# Altium footprint library Cty1.PcbLib: 1378 footprints (part 1 of 87)
Each footprint in its own frame and in the unit in brackets; x right, y up, seen from the top. Pads: shape width x height; smd on the part's side, far side on the other; paste and mask are expansions set on the pad; w line width, h text height; cw(c..) or ccw(c..) is an arc to the next point about the centre after c.
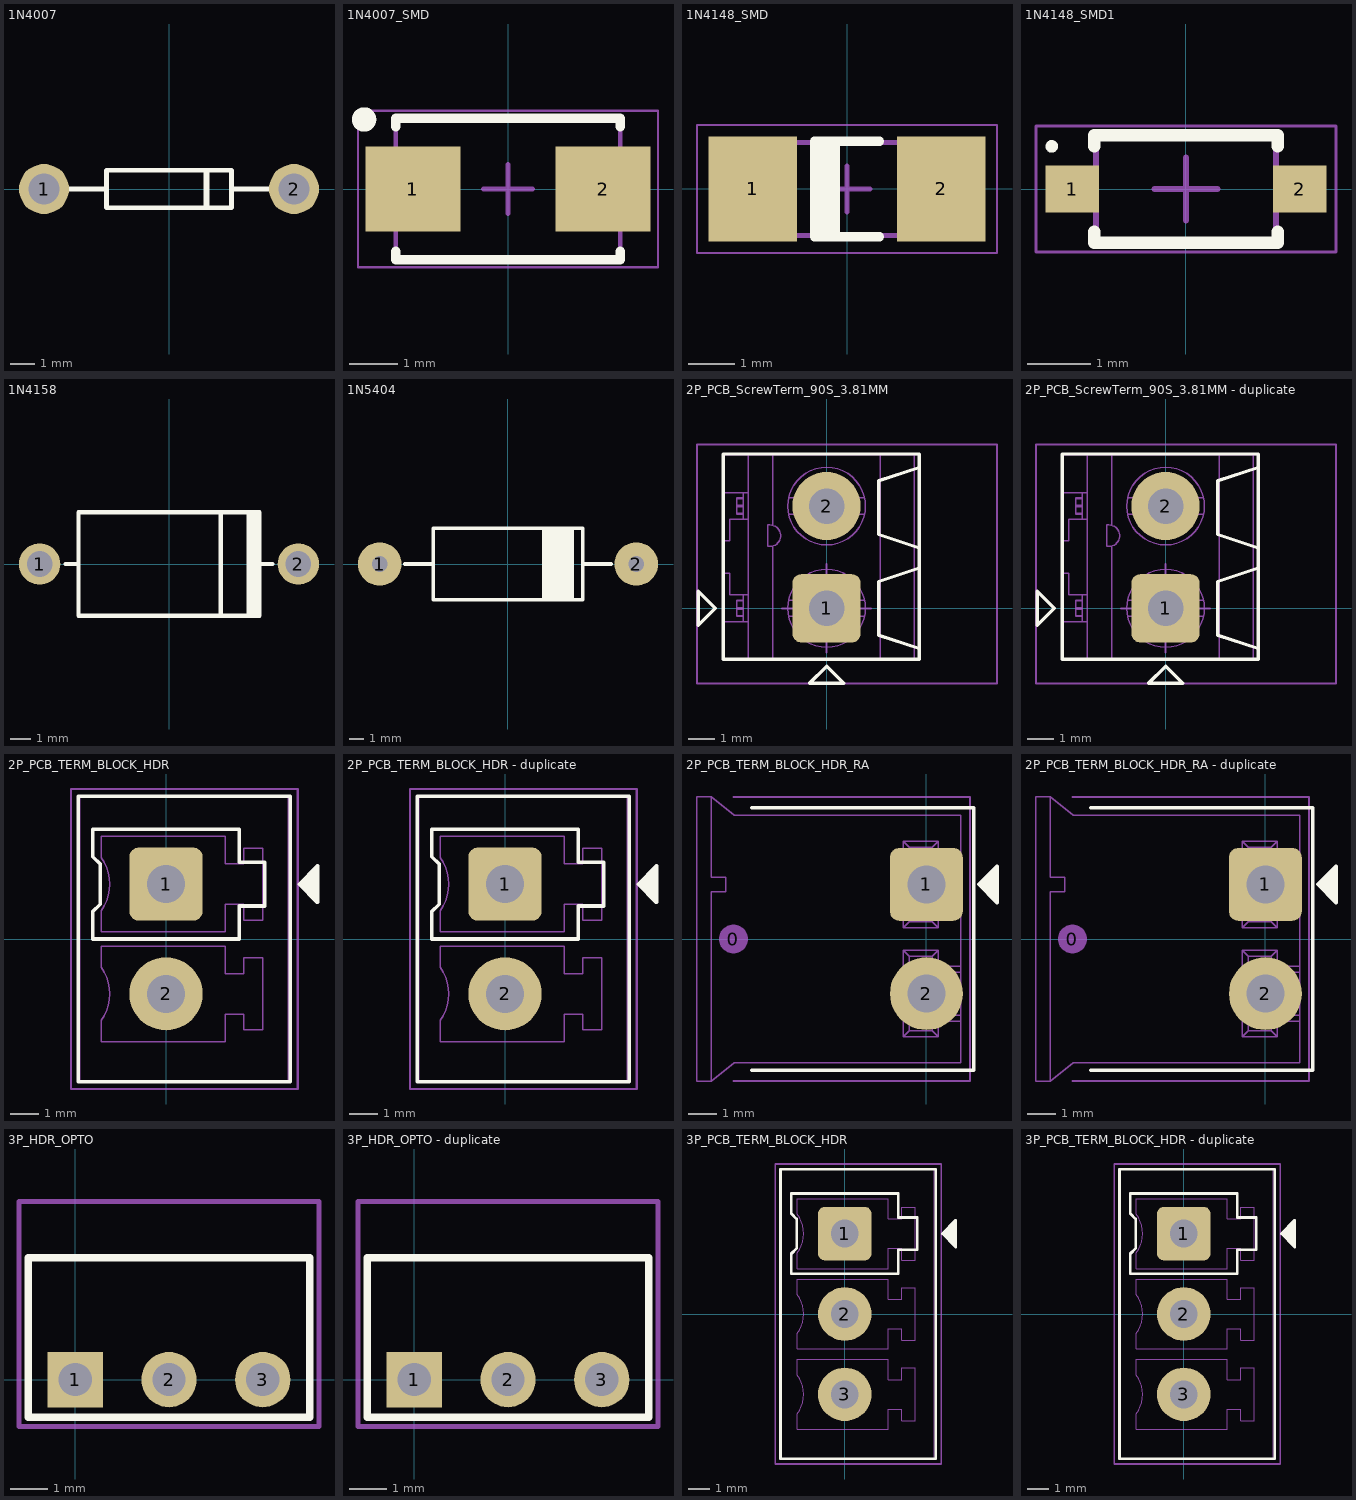
[diagram p0: the footprints below, top view; thin cyan lines are the x and y axes]

## 1N4007 [mil] "Diode 2A"
height 20
pads (2):
  round 80 hole 50: 1(-200,0) 2(200,0)
Top Overlay:
  lines w7.87: -170,0 -101,0 ; 100,0 200,0 ; -100,-30 100,-30 100,30 -100,30 -100,-30
  lines w10: 60,-27 60,27

## 1N4007_SMD [mm] "SODFL, 2-Leads, Body 2.90x5.30mm, IPC Medium Density"
height 2.44
pads (2):
  rect 1.95x1.75 smd: 1(-1.95,0) 2(1.95,0)
Top Overlay:
  circle w0.25: c-2.95,1.425 r0.125
  lines w0.2: -2.3,-1.275 -2.3,-1.45 2.3,-1.45 2.3,-1.275 ; -2.3,1.275 -2.3,1.45 2.3,1.45 2.3,1.275
Mechanical 13:
  lines w0.1: -2.3,-1.45 2.3,-1.45 2.3,1.45 -2.3,1.45 -2.3,-1.45
Mechanical 15:
  lines w0.05: -3.075,-1.6 3.075,-1.6 3.075,1.6 -3.075,1.6 -3.075,-1.6
  lines w0.1: -0.5,0 0.5,0 ; 0,-0.5 0,0.5
3D body "User Library-DO-214AC(SMA).STEP": height 2.3, standoff 0.01, extent -2.743,-1.397 2.743,1.397

## 1N4148_SMD [mm] "MELF Diode, 2-Leads, Body 5.00x2.00mm, IPC Medium Density"
height 2
pads (2):
  rect 1.9x2.25 smd: 1(-2.025,0) 2(2.025,0)
Top Overlay:
  rectangle: -0.7,-1.025 -0.15,1.025
  lines w0.2: 0.7,-1.025 -0.7,-1.025 -0.7,1.025 0.7,1.025
Mechanical 13:
  lines w0.1: -2.5,-1 2.5,-1 2.5,1 -2.5,1 -2.5,-1
Mechanical 15:
  lines w0.05: -3.225,-1.375 3.225,-1.375 3.225,1.375 -3.225,1.375 -3.225,-1.375
  lines w0.1: -0.5,0 0.5,0 ; 0,-0.5 0,0.5
3D body: height 1.98, standoff 0.04, extent -1.25,-0.97 1.25,0.966
3D body: height 1.99, standoff 0, extent -2.5,-1 -1.25,0.996
3D body: height 1.98, standoff 0.04, extent -0.65,-0.971 -0.05,0.967
3D body: height 1.99, standoff 0, extent 1.25,-1 2.5,0.996

## 1N4148_SMD1 [mm] "SODFL, 2-Leads, Body 1.70x3.90mm, IPC Medium Density"
height 1.45
pads (2):
  rect 0.85x0.75 smd: 1(-1.8,0) 2(1.8,0)
Top Overlay:
  circle w0.1: c-2.125,0.675 r0.05
  lines w0.2: -1.45,-0.675 -1.45,-0.85 1.45,-0.85 1.45,-0.675 ; -1.45,0.675 -1.45,0.85 1.45,0.85 1.45,0.675
Mechanical 13:
  lines w0.1: -1.425,-0.85 1.425,-0.85 1.425,0.85 -1.425,0.85 -1.425,-0.85
Mechanical 15:
  lines w0.05: -2.375,-1 2.375,-1 2.375,1 -2.375,1 -2.375,-1
  lines w0.1: -0.5,0 0.5,0 ; 0,-0.5 0,0.5
3D body "User Library-1N4148WSm.STEP": height 1.06, standoff -0.04, extent -1.877,-0.85 1.877,0.85

## 1N4158 [mil] "Diode 5A"
height 118.11
pads (2):
  round 80 hole 50: 1(-250,0) 2(250,0)
Top Overlay:
  rectangle: 150,-100 175,100
  lines w7.87: -200,0 -175,0 ; 100,-100 100,100 ; 175,0 200,0 ; -175,-100 -175,100 175,100 175,-100 -175,-100

## 1N5404 [mil]
pads (2):
  round 120 hole 44: 1(-354.33,0) 2(354.33,0)
Top Overlay:
  rectangle: 98.43,-98.43 177.17,98.43
  lines w10: -285.43,0 -206.69,0 ; 98.43,-98.43 98.43,98.43 ; 177.17,-98.43 177.17,98.43 ; 206.69,0 285.43,0 ; -206.69,-98.43 -206.69,98.43 206.69,98.43 206.69,-98.43 -206.69,-98.43
3D body "DIODE07-3D.STEP": height 200, standoff -100, extent -370,-98.43 370,101.57

## 2P_PCB_ScrewTerm_90S_3.81MM [mil] "TERM BLOCK 2POS SIDE ENT STACKABLE 3.81MM"
height 334.65
pads (2):
  rrect25% 100x100 hole 52: 1(0,0)
  round 100 hole 52: 2(0,150)
Top Overlay:
  lines w5: 135.83,-59.06 76.78,-39.37 76.78,39.37 135.83,59.06 ; 135.83,88.58 76.78,108.27 76.78,187.01 135.83,206.69 ; -188,-25 -188,25 -163,0 -188,-25 ; -151.57,-75 135.83,-75 135.83,226.38 -151.57,226.38 -151.57,-75 ; -25,-110 0,-85 25,-110 -25,-110
Mechanical 13:
  circle w1.97: c0,150 r57.09
  circle w1.97: c0,0 r57.09
  lines w1.97: -151.57,-19.69 -114.76,-19.69 -114.76,19.68 -141.73,19.68 -141.73,51.18 -151.57,51.18 ; -151.57,98.82 -141.73,98.82 -141.73,130.31 -114.76,130.31 -114.76,169.69 -151.57,169.69 ; -131.89,-10.91 -122.05,-10.91 ; -131.89,-1.06 -122.05,-1.06 ; -131.89,1.06 -122.05,1.06 ; -131.89,10.91 -122.05,10.91 ; -131.89,139.09 -122.05,139.09 ; -131.89,148.94 -122.05,148.94 ; -131.89,151.06 -122.05,151.06 ; -131.89,160.91 -122.05,160.91 ; -122.05,-19.69 -122.05,19.68 ; -122.05,-11.81 -131.89,-11.81 -131.89,11.81 -122.05,11.81 ; -122.05,130.31 -122.05,169.69 ; -122.05,138.19 -131.89,138.19 -131.89,161.81 -122.05,161.81 ; -114.56,-75 -114.56,225 ; -78.74,-75 -78.74,91.34 ; -78.74,121.65 -78.74,225 ; -55.85,-11.81 55.85,-11.81 ; -55.85,11.81 55.85,11.81 ; -55.85,138.19 55.85,138.19 ; -55.85,161.81 55.85,161.81 ; 78.74,-75 78.74,225 ; 128.89,-75 128.89,225 ; -151.57,-75 135.83,-75 135.83,225 -151.57,225 -151.57,-75 ; -85.91,90.75 -85.91,122.24 -83.03,122.24 cw(c-83.03,106.5) -83.03,90.75 -85.91,90.75
Mechanical 15:
  lines w3: -65,0 65,0 ; 0,-65 0,65 ; -190,-110 250,-110 250,240 -190,240 -190,-110
3D body "c-1776113-2-o-3d.stp": height 334.65, standoff -137.8, extent -151.57,-75.2 135.83,224.8

## 2P_PCB_ScrewTerm_90S_3.81MM - duplicate [mil] "TERM BLOCK 2POS SIDE ENT STACKABLE 3.81MM"
height 334.65
pads (2):
  rrect25% 100x100 hole 52: 1(0,0)
  round 100 hole 52: 2(0,150)
Top Overlay:
  lines w5: 135.83,-59.06 76.78,-39.37 76.78,39.37 135.83,59.06 ; 135.83,88.58 76.78,108.27 76.78,187.01 135.83,206.69 ; -188,-25 -163,0 -188,25 -188,-25 ; -151.57,-75 -151.57,226.38 135.83,226.38 135.83,-75 -151.57,-75 ; -25,-110 25,-110 0,-85 -25,-110
Mechanical 13:
  circle w1.97: c0,0 r57.09
  circle w1.97: c0,150 r57.09
  lines w1.97: -151.57,-19.69 -114.76,-19.69 -114.76,19.68 -141.73,19.68 -141.73,51.18 -151.57,51.18 ; -151.57,98.82 -141.73,98.82 -141.73,130.31 -114.76,130.31 -114.76,169.69 -151.57,169.69 ; -131.89,-10.91 -122.05,-10.91 ; -131.89,-1.06 -122.05,-1.06 ; -131.89,1.06 -122.05,1.06 ; -131.89,10.91 -122.05,10.91 ; -131.89,139.09 -122.05,139.09 ; -131.89,148.94 -122.05,148.94 ; -131.89,151.06 -122.05,151.06 ; -131.89,160.91 -122.05,160.91 ; -122.05,-19.69 -122.05,19.68 ; -122.05,-11.81 -131.89,-11.81 -131.89,11.81 -122.05,11.81 ; -122.05,130.31 -122.05,169.69 ; -122.05,138.19 -131.89,138.19 -131.89,161.81 -122.05,161.81 ; -114.56,-75 -114.56,225 ; -78.74,-75 -78.74,91.34 ; -78.74,121.65 -78.74,225 ; -55.85,-11.81 55.85,-11.81 ; -55.85,11.81 55.85,11.81 ; -55.85,138.19 55.85,138.19 ; -55.85,161.81 55.85,161.81 ; 78.74,-75 78.74,225 ; 128.89,-75 128.89,225 ; -151.57,-75 -151.57,225 135.83,225 135.83,-75 -151.57,-75 ; -85.91,90.75 -83.03,90.75 ccw(c-83.03,106.5) -83.03,122.24 -85.91,122.24 -85.91,90.75
Mechanical 15:
  lines w3: -65,0 65,0 ; 0,-65 0,65 ; -190,-110 -190,240 250,240 250,-110 -190,-110
3D body "c-1776113-2-o-3d.stp": height 334.65, standoff -137.8, extent -151.57,-75.2 135.83,224.8

## 2P_PCB_TERM_BLOCK_HDR [mil] "TERM BLOCK HDR 2POS 3.81MM"
height 362.2
pads (2):
  rrect25% 100x100 hole 52: 1(0,75)
  round 100 hole 52: 2(0,-75)
Top Overlay:
  region: 182,75 207,100 207,50
  lines w5: -120,-195.08 -120,195.08 ; -120,-195 170,-195 ; -120,195 170,195 ; 170,-195.08 170,195.08 ; -100,0 100,0 100,45 135,45 135,105 100,105 100,150 -100,150 -100,112.5 -90,102.5 -90,47.5 -100,37.5 -100,0 ; 182,75 207,100 207,50 182,75
Mechanical 13:
  circle w1.97: c0,-75 r43.31
  circle w1.97: c0,75 r43.31
  circle w1.97: c0,75 r35.43
  circle w1.97: c0,-75 r35.43
  lines w1.97: -118.11,-195.08 -118.11,195.08 167.32,195.08 167.32,-195.08 -118.11,-195.08 ; -88.58,-140.16 -88.58,-111.08 ccw(c-137.8,-75) -88.58,-38.92 -88.58,-9.84 80.71,-9.84 80.71,-47.44 106.3,-47.44 106.3,-25.79 131.89,-25.79 131.89,-124.21 106.3,-124.21 106.3,-102.56 80.71,-102.56 80.71,-140.16 -88.58,-140.16 ; -88.58,9.84 -88.58,38.92 ccw(c-137.8,75) -88.58,111.08 -88.58,140.16 80.71,140.16 80.71,102.56 106.3,102.56 106.3,124.21 131.89,124.21 131.89,25.79 106.3,25.79 106.3,47.44 80.71,47.44 80.71,9.84 -88.58,9.84 ; -15.75,-90.75 15.75,-90.75 15.75,-59.25 -15.75,-59.25 -15.75,-90.75 ; -15.75,59.25 15.75,59.25 15.75,90.75 -15.75,90.75 -15.75,59.25
Mechanical 15:
  lines w3: -130,-205 180,-205 180,205 -130,205 -130,-205
3D body "CONN HEADER TE 2P.STEP": height 362.2, standoff -133.86, extent -118.1,-195.07 167.33,195.08

## 2P_PCB_TERM_BLOCK_HDR - duplicate [mil] "TERM BLOCK HDR 2POS 3.81MM"
height 362.2
pads (2):
  rrect25% 100x100 hole 52: 1(0,75)
  round 100 hole 52: 2(0,-75)
Top Overlay:
  region: 182,75 207,100 207,50
  lines w5: -120,-195.08 -120,195.08 ; -120,-195 170,-195 ; -120,195 170,195 ; 170,-195.08 170,195.08 ; -100,0 -100,37.5 -90,47.5 -90,102.5 -100,112.5 -100,150 100,150 100,105 135,105 135,45 100,45 100,0 -100,0 ; 182,75 207,50 207,100 182,75
Mechanical 13:
  circle w1.97: c0,-75 r35.43
  circle w1.97: c0,75 r35.43
  circle w1.97: c0,75 r43.31
  circle w1.97: c0,-75 r43.31
  lines w1.97: -118.11,-195.08 167.32,-195.08 167.32,195.08 -118.11,195.08 -118.11,-195.08 ; -88.58,-140.16 80.71,-140.16 80.71,-102.56 106.3,-102.56 106.3,-124.21 131.89,-124.21 131.89,-25.79 106.3,-25.79 106.3,-47.44 80.71,-47.44 80.71,-9.84 -88.58,-9.84 -88.58,-38.92 cw(c-137.8,-75) -88.58,-111.08 -88.58,-140.16 ; -88.58,9.84 80.71,9.84 80.71,47.44 106.3,47.44 106.3,25.79 131.89,25.79 131.89,124.21 106.3,124.21 106.3,102.56 80.71,102.56 80.71,140.16 -88.58,140.16 -88.58,111.08 cw(c-137.8,75) -88.58,38.92 -88.58,9.84 ; -15.75,-90.75 -15.75,-59.25 15.75,-59.25 15.75,-90.75 -15.75,-90.75 ; -15.75,59.25 -15.75,90.75 15.75,90.75 15.75,59.25 -15.75,59.25
Mechanical 15:
  lines w3: -130,-205 -130,205 180,205 180,-205 -130,-205
3D body "CONN HEADER TE 2P.STEP": height 362.2, standoff -133.86, extent -118.1,-195.07 167.33,195.08

## 2P_PCB_TERM_BLOCK_HDR_RA [mil] "TERM BLOCK HDR 2POS 3.81MM RIGHT-ANGLE"
height 362.2
pads (3):
  round 40 on Mech15: 0(-265,0)
  rrect25% 100x100 hole 52: 1(0,75)
  round 100 hole 52: 2(0,-75)
Top Overlay:
  region: 72,75 97,100 97,50
  lines w5: -240,-180 65,-180 65,180 -240,180 ; 72,75 97,50 97,100 72,75
Mechanical 13:
  lines w1.97: 47.24,-112.8 7.87,-112.8 ; 47.24,-104.53 16.14,-104.53 ; 47.24,-45.47 16.14,-45.47 ; 47.24,-37.2 7.87,-37.2 ; 47.24,37.2 7.87,37.2 ; 47.24,45.47 16.14,45.47 ; 47.24,104.53 16.14,104.53 ; 47.24,112.8 7.87,112.8 ; -295.28,-195.08 -295.28,65.16 -275.59,65.16 -275.59,84.84 -295.28,84.84 -295.28,195.08 ; -295.28,-195.08 -314.96,-195.08 -314.96,195.08 -295.28,195.08 ; -295.28,-195.08 -263.78,-169.88 47.24,-169.88 47.24,169.88 -263.78,169.88 -295.28,195.08 ; -31.89,-134.45 -31.89,-15.55 ; -31.89,-134.45 16.14,-134.45 ; -31.89,-134.45 -23.62,-126.18 ; -31.89,-15.55 16.14,-15.55 ; -31.89,-15.55 -23.62,-23.82 ; -31.89,15.55 -31.89,134.45 ; -31.89,15.55 16.14,15.55 ; -31.89,15.55 -23.62,23.82 ; -31.89,134.45 16.14,134.45 ; -31.89,134.45 -23.62,126.18 ; -23.62,-126.18 -23.62,-23.82 ; -23.62,-126.18 7.87,-126.18 ; -23.62,-23.82 7.87,-23.82 ; -23.62,23.82 -23.62,126.18 ; -23.62,23.82 7.87,23.82 ; -23.62,126.18 7.87,126.18 ; 7.87,-126.18 16.14,-134.45 ; 7.87,-126.18 7.87,-112.8 ; 7.87,-112.8 cw(c16.14,-112.8) 16.14,-104.53 ; 7.87,-37.2 ccw(c16.14,-37.2) 16.14,-45.47 ; 7.87,-37.2 7.87,-23.82 ; 7.87,-23.82 16.14,-15.55 ; 7.87,23.82 16.14,15.55 ; 7.87,23.82 7.87,37.2 ; 7.87,37.2 cw(c16.14,37.2) 16.14,45.47 ; 7.87,112.8 ccw(c16.14,112.8) 16.14,104.53 ; 7.87,112.8 7.87,126.18 ; 7.87,126.18 16.14,134.45 ; 16.14,-134.45 16.14,-104.53 ; 16.14,-45.47 16.14,-15.55 ; 16.14,15.55 16.14,45.47 ; 16.14,104.53 16.14,134.45
Mechanical 15:
  lines w3: -265,-195 60,-195 60,195 -265,195
3D body "CONN RA HEADER TE 2P.STEP": height 291.34, standoff -129.92, extent -314.95,-195.07 47.25,195.08

## 2P_PCB_TERM_BLOCK_HDR_RA - duplicate [mil] "TERM BLOCK HDR 2POS 3.81MM RIGHT-ANGLE"
height 362.2
pads (3):
  round 40 on Mech15: 0(-265,0)
  rrect25% 100x100 hole 52: 1(0,75)
  round 100 hole 52: 2(0,-75)
Top Overlay:
  region: 72,75 97,100 97,50
  lines w5: -240,-180 65,-180 65,180 -240,180 ; 72,75 97,50 97,100 72,75
Mechanical 13:
  lines w1.97: 47.24,-112.8 7.87,-112.8 ; 47.24,-104.53 16.14,-104.53 ; 47.24,-45.47 16.14,-45.47 ; 47.24,-37.2 7.87,-37.2 ; 47.24,37.2 7.87,37.2 ; 47.24,45.47 16.14,45.47 ; 47.24,104.53 16.14,104.53 ; 47.24,112.8 7.87,112.8 ; -295.28,-195.08 -295.28,65.16 -275.59,65.16 -275.59,84.84 -295.28,84.84 -295.28,195.08 ; -295.28,-195.08 -314.96,-195.08 -314.96,195.08 -295.28,195.08 ; -295.28,-195.08 -263.78,-169.88 47.24,-169.88 47.24,169.88 -263.78,169.88 -295.28,195.08 ; -31.89,-134.45 -31.89,-15.55 ; -31.89,-134.45 16.14,-134.45 ; -31.89,-134.45 -23.62,-126.18 ; -31.89,-15.55 16.14,-15.55 ; -31.89,-15.55 -23.62,-23.82 ; -31.89,15.55 -31.89,134.45 ; -31.89,15.55 16.14,15.55 ; -31.89,15.55 -23.62,23.82 ; -31.89,134.45 16.14,134.45 ; -31.89,134.45 -23.62,126.18 ; -23.62,-126.18 -23.62,-23.82 ; -23.62,-126.18 7.87,-126.18 ; -23.62,-23.82 7.87,-23.82 ; -23.62,23.82 -23.62,126.18 ; -23.62,23.82 7.87,23.82 ; -23.62,126.18 7.87,126.18 ; 7.87,-126.18 16.14,-134.45 ; 7.87,-126.18 7.87,-112.8 ; 7.87,-112.8 cw(c16.14,-112.8) 16.14,-104.53 ; 7.87,-37.2 ccw(c16.14,-37.2) 16.14,-45.47 ; 7.87,-37.2 7.87,-23.82 ; 7.87,-23.82 16.14,-15.55 ; 7.87,23.82 16.14,15.55 ; 7.87,23.82 7.87,37.2 ; 7.87,37.2 cw(c16.14,37.2) 16.14,45.47 ; 7.87,112.8 ccw(c16.14,112.8) 16.14,104.53 ; 7.87,112.8 7.87,126.18 ; 7.87,126.18 16.14,134.45 ; 16.14,-134.45 16.14,-104.53 ; 16.14,-45.47 16.14,-15.55 ; 16.14,15.55 16.14,45.47 ; 16.14,104.53 16.14,134.45
Mechanical 15:
  lines w3: -265,-195 60,-195 60,195 -265,195
3D body "CONN RA HEADER TE 2P.STEP": height 291.34, standoff -129.92, extent -314.95,-195.07 47.25,195.08

## 3P_HDR_OPTO [mm] "Connector; screwterm; 3 Position"
height 10
pads (3):
  rect 1.5x1.5 hole 0.9: 1(0,0)
  round 1.5 hole 0.9: 2(2.54,0) 3(5.08,0)
Top Overlay:
  lines w0.2: -1.27,-1.016 6.35,-1.016 6.35,3.302 -1.27,3.302 -1.27,-1.016
Mechanical 15:
  lines w0.127: -1.524,-1.27 6.604,-1.27 6.604,4.826 -1.524,4.826 -1.524,-1.27
3D body "c-640455-3-y-3d.stp": height 6.48, standoff -3.56, extent -1.27,-0.317 6.35,10.732

## 3P_HDR_OPTO - duplicate [mm] "Connector; screwterm; 3 Position"
height 10
pads (3):
  rect 1.5x1.5 hole 0.9: 1(0,0)
  round 1.5 hole 0.9: 2(2.54,0) 3(5.08,0)
Top Overlay:
  lines w0.2: -1.27,-1.016 -1.27,3.302 6.35,3.302 6.35,-1.016 -1.27,-1.016
Mechanical 15:
  lines w0.127: -1.524,-1.27 -1.524,4.826 6.604,4.826 6.604,-1.27 -1.524,-1.27
3D body "c-640455-3-y-3d.stp": height 6.48, standoff -3.56, extent -1.27,-0.317 6.35,10.732

## 3P_PCB_TERM_BLOCK_HDR [mil] "TERM BLOCK HDR 3POS 3.81MM"
height 362.2
pads (3):
  rrect25% 100x100 hole 52: 1(0,150)
  round 100 hole 52: 2(0,0) 3(0,-150)
Top Overlay:
  region: 182,150 207,175 207,125
  lines w5: -120,-270 -120,270 170,270 170,-270 -120,-270 ; -100,75 -100,112.5 -90,122.5 -90,177.5 -100,187.5 -100,225 100,225 100,180 135,180 135,120 100,120 100,75 -100,75 ; 182,150 207,125 207,175 182,150
Mechanical 13:
  circle w1.97: c0,-150 r43.31
  circle w1.97: c0,0 r43.31
  circle w1.97: c0,150 r43.31
  circle w1.97: c0,0 r35.43
  circle w1.97: c0,-150 r35.43
  circle w1.97: c0,150 r35.43
  lines w1.97: -118.11,-270.08 167.32,-270.08 167.32,270.08 -118.11,270.08 -118.11,-270.08 ; -88.58,-215.16 80.71,-215.16 80.71,-177.56 106.3,-177.56 106.3,-199.21 131.89,-199.21 131.89,-100.79 106.3,-100.79 106.3,-122.44 80.71,-122.44 80.71,-84.84 -88.58,-84.84 -88.58,-113.92 cw(c-137.8,-150) -88.58,-186.08 -88.58,-215.16 ; -88.58,-65.16 -88.58,-36.08 ccw(c-137.8,0) -88.58,36.08 -88.58,65.16 80.71,65.16 80.71,27.56 106.3,27.56 106.3,49.21 131.89,49.21 131.89,-49.21 106.3,-49.21 106.3,-27.56 80.71,-27.56 80.71,-65.16 -88.58,-65.16 ; -88.58,84.84 80.71,84.84 80.71,122.44 106.3,122.44 106.3,100.79 131.89,100.79 131.89,199.21 106.3,199.21 106.3,177.56 80.71,177.56 80.71,215.16 -88.58,215.16 -88.58,186.08 cw(c-137.8,150) -88.58,113.92 -88.58,84.84 ; -15.75,-165.75 -15.75,-134.25 15.75,-134.25 15.75,-165.75 -15.75,-165.75 ; -15.75,-15.75 -15.75,15.75 15.75,15.75 15.75,-15.75 -15.75,-15.75 ; -15.75,134.25 15.75,134.25 15.75,165.75 -15.75,165.75 -15.75,134.25
Mechanical 15:
  lines w3: -130,-280 -130,280 180,280 180,-280 -130,-280
3D body "CONN HEADER TE 3P.STEP": height 362.2, standoff -133.86, extent -118.1,-270.08 167.33,270.08

## 3P_PCB_TERM_BLOCK_HDR - duplicate [mil] "TERM BLOCK HDR 3POS 3.81MM"
height 362.2
pads (3):
  rrect25% 100x100 hole 52: 1(0,150)
  round 100 hole 52: 2(0,0) 3(0,-150)
Top Overlay:
  region: 182,150 207,175 207,125
  lines w5: -120,-270 -120,270 170,270 170,-270 -120,-270 ; -100,75 -100,112.5 -90,122.5 -90,177.5 -100,187.5 -100,225 100,225 100,180 135,180 135,120 100,120 100,75 -100,75 ; 182,150 207,125 207,175 182,150
Mechanical 13:
  circle w1.97: c0,-150 r43.31
  circle w1.97: c0,0 r43.31
  circle w1.97: c0,150 r43.31
  circle w1.97: c0,0 r35.43
  circle w1.97: c0,-150 r35.43
  circle w1.97: c0,150 r35.43
  lines w1.97: -118.11,-270.08 167.32,-270.08 167.32,270.08 -118.11,270.08 -118.11,-270.08 ; -88.58,-215.16 80.71,-215.16 80.71,-177.56 106.3,-177.56 106.3,-199.21 131.89,-199.21 131.89,-100.79 106.3,-100.79 106.3,-122.44 80.71,-122.44 80.71,-84.84 -88.58,-84.84 -88.58,-113.92 cw(c-137.8,-150) -88.58,-186.08 -88.58,-215.16 ; -88.58,-65.16 -88.58,-36.08 ccw(c-137.8,0) -88.58,36.08 -88.58,65.16 80.71,65.16 80.71,27.56 106.3,27.56 106.3,49.21 131.89,49.21 131.89,-49.21 106.3,-49.21 106.3,-27.56 80.71,-27.56 80.71,-65.16 -88.58,-65.16 ; -88.58,84.84 80.71,84.84 80.71,122.44 106.3,122.44 106.3,100.79 131.89,100.79 131.89,199.21 106.3,199.21 106.3,177.56 80.71,177.56 80.71,215.16 -88.58,215.16 -88.58,186.08 cw(c-137.8,150) -88.58,113.92 -88.58,84.84 ; -15.75,-165.75 -15.75,-134.25 15.75,-134.25 15.75,-165.75 -15.75,-165.75 ; -15.75,-15.75 -15.75,15.75 15.75,15.75 15.75,-15.75 -15.75,-15.75 ; -15.75,134.25 15.75,134.25 15.75,165.75 -15.75,165.75 -15.75,134.25
Mechanical 15:
  lines w3: -130,-280 -130,280 180,280 180,-280 -130,-280
3D body "CONN HEADER TE 3P.STEP": height 362.2, standoff -133.86, extent -118.1,-270.08 167.33,270.08